# Altium footprint library Nanjar's Library.PcbLib: 153 footprints (part 1 of 10)
Each footprint in its own frame and in the unit in brackets; x right, y up, seen from the top. Pads: shape width x height; smd on the part's side, far side on the other; paste and mask are expansions set on the pad; w line width, h text height; cw(c..) or ccw(c..) is an arc to the next point about the centre after c.
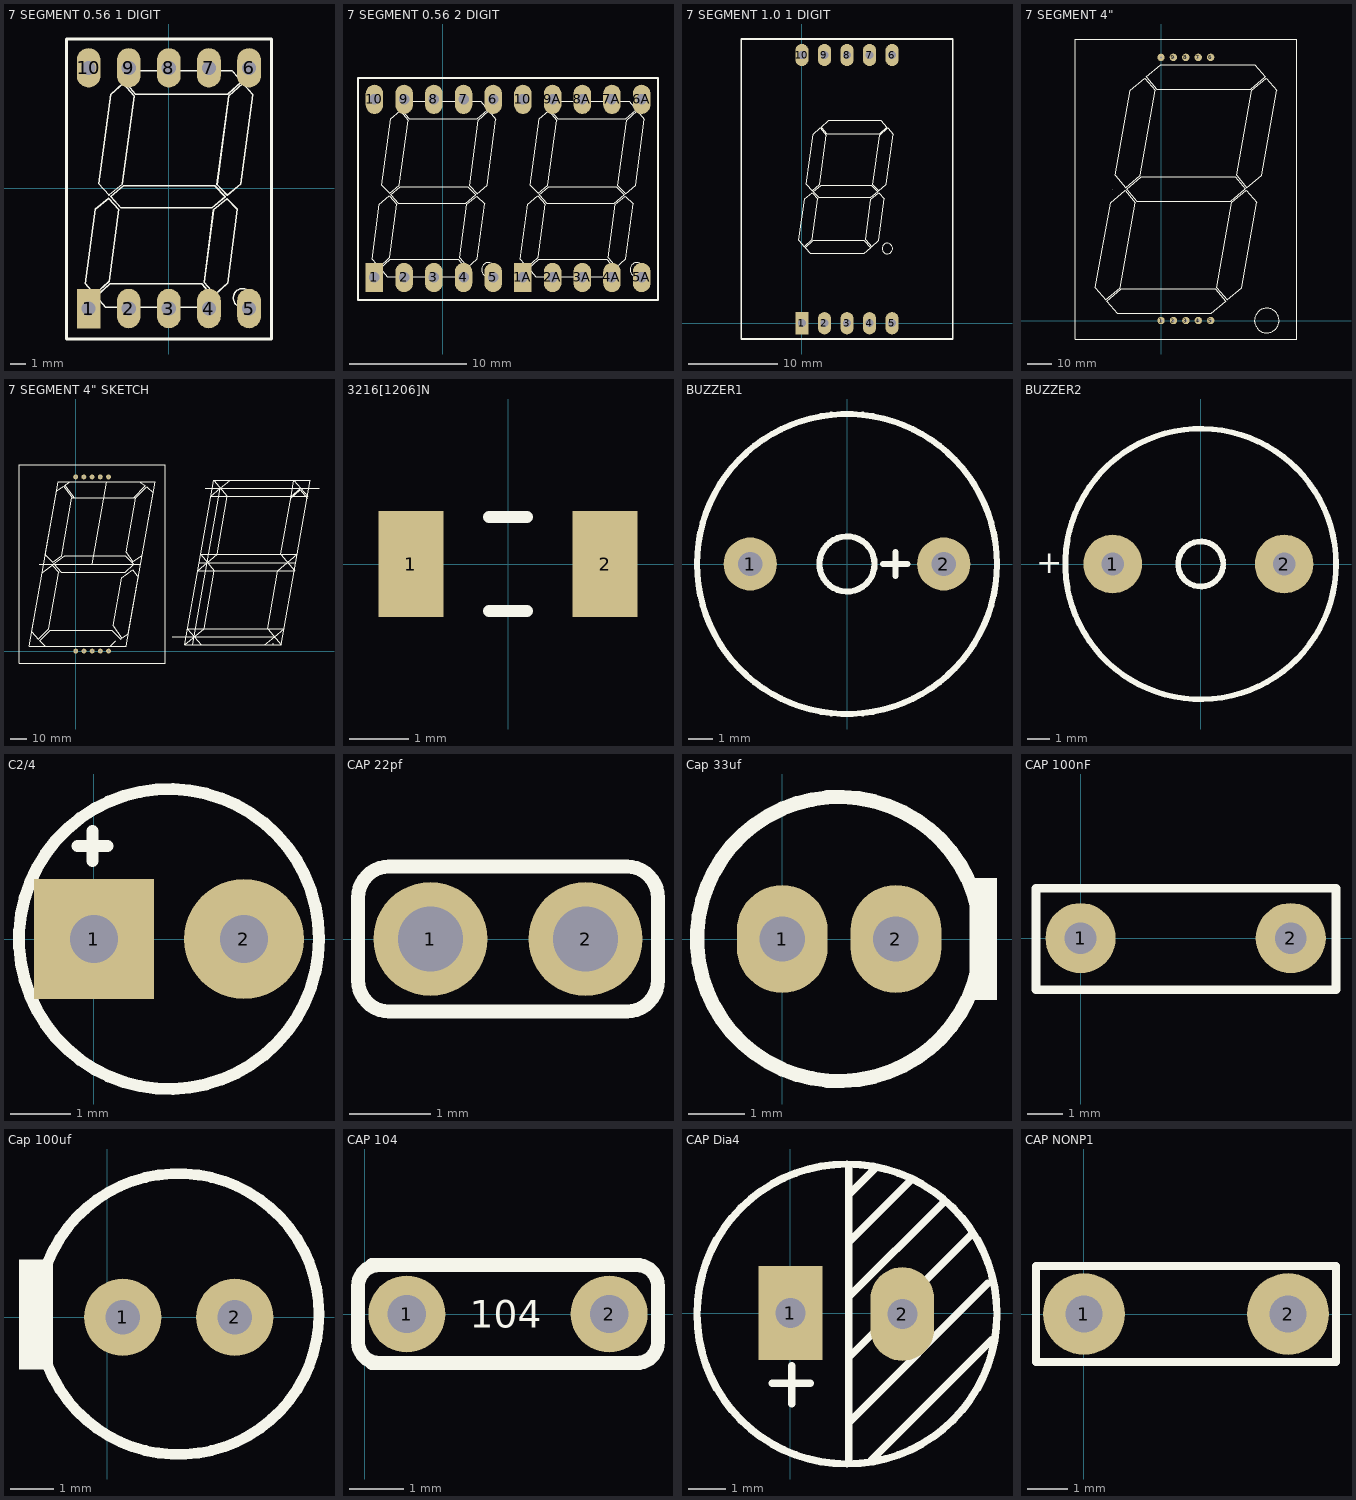
[diagram p0: the footprints below, top view; thin cyan lines are the x and y axes]

## 7 SEGMENT 0.56 1 DIGIT [mm]
pads (10):
  rect 1.5x2.5 hole 0.9: 1(-5.08,-7.62)
  oval 1.5x2.5 hole 0.9: 2(-2.54,-7.62) 3(0,-7.62) 4(2.54,-7.62) 5(5.08,-7.62) 6(5.08,7.62) 7(2.54,7.62) 8(0,7.62) 9(-2.54,7.62) 10(-5.08,7.62)
Top Overlay:
  circle w0.1: c4.676,-6.95 r0.595
  lines w0.1: -5.289,-6.04 -4.66,-1.335 -3.809,-0.643 -3.169,-1.34 -3.769,-5.9 -4.689,-6.73 -5.289,-6.04 ; -4.599,-6.85 -3.989,-7.55 2.021,-7.55 2.791,-6.86 2.091,-6.05 -3.719,-6.05 -4.599,-6.85 ; -4.449,0.29 -3.789,-0.43 -2.939,0.27 -2.199,5.84 -2.889,6.64 -3.683,5.939 -4.449,0.29 ; -3.679,-0.53 -2.869,0.15 2.911,0.15 3.579,-0.545 2.722,-1.25 -3.029,-1.25 -3.679,-0.53 ; -2.779,6.74 -1.989,7.45 4.001,7.45 4.611,6.74 3.731,5.95 -2.109,5.95 -2.779,6.74 ; 2.231,-5.95 2.831,-1.37 3.681,-0.66 4.341,-1.33 3.721,-6.01 2.911,-6.74 2.231,-5.95 ; 3.051,0.23 3.704,-0.441 4.557,0.27 5.311,5.93 4.701,6.64 3.801,5.84 3.051,0.23
  lines w0.2: -6.489,-9.55 -6.489,9.45 6.511,9.45 6.511,-9.55 -6.489,-9.55
3D body "7 SEGMENT 0.56 inc.step": height 8, standoff -4, extent -6.35,-9.525 6.35,9.525

## 7 SEGMENT 0.56 2 DIGIT [mm]
pads (20):
  rect 1.5x2.5 hole 0.9: 1(-5.842,6.985) 1A(6.858,6.985)
  oval 1.5x2.5 hole 0.9: 2(-3.302,6.985) 2A(9.398,6.985) 3(-0.762,6.985) 3A(11.938,6.985) 4(1.778,6.985) 4A(14.478,6.985) 5(4.318,6.985) 5A(17.018,6.985) 6(4.318,22.225) 6A(17.018,22.225) 7(1.778,22.225) 7A(14.478,22.225) 8(-0.762,22.225) 8A(11.938,22.225) 9(-3.302,22.225) 9A(9.398,22.225) 10(-5.842,22.225) 10(6.858,22.225)
Top Overlay:
  circle w0.1: c16.614,7.655 r0.595
  circle w0.1: c3.914,7.655 r0.595
  lines w0.1: -6.051,8.565 -5.422,13.27 -4.571,13.962 -3.931,13.265 -4.531,8.705 -5.451,7.875 -6.051,8.565 ; -5.361,7.755 -4.751,7.055 1.259,7.055 2.029,7.745 1.329,8.555 -4.481,8.555 -5.361,7.755 ; -5.211,14.895 -4.551,14.175 -3.701,14.875 -2.961,20.445 -3.651,21.245 -4.445,20.544 -5.211,14.895 ; -4.441,14.075 -3.631,14.755 2.149,14.755 2.817,14.06 1.96,13.355 -3.791,13.355 -4.441,14.075 ; -3.541,21.345 -2.751,22.055 3.239,22.055 3.849,21.345 2.969,20.555 -2.871,20.555 -3.541,21.345 ; 1.469,8.655 2.069,13.235 2.919,13.945 3.579,13.275 2.959,8.595 2.149,7.865 1.469,8.655 ; 2.289,14.835 2.942,14.164 3.795,14.875 4.549,20.535 3.939,21.245 3.039,20.445 2.289,14.835 ; 6.649,8.565 7.249,7.875 8.169,8.705 8.769,13.265 8.129,13.962 7.278,13.27 6.649,8.565 ; 7.339,7.755 8.219,8.555 14.029,8.555 14.729,7.745 13.959,7.055 7.949,7.055 7.339,7.755 ; 7.489,14.895 8.255,20.544 9.049,21.245 9.739,20.445 8.999,14.875 8.149,14.175 7.489,14.895 ; 8.259,14.075 8.909,13.355 14.66,13.355 15.517,14.06 14.849,14.755 9.069,14.755 8.259,14.075 ; 9.159,21.345 9.829,20.555 15.669,20.555 16.549,21.345 15.939,22.055 9.949,22.055 9.159,21.345 ; 14.169,8.655 14.849,7.865 15.659,8.595 16.279,13.275 15.619,13.945 14.769,13.235 14.169,8.655 ; 14.989,14.835 15.739,20.445 16.639,21.245 17.249,20.535 16.495,14.875 15.642,14.164 14.989,14.835
  lines w0.2: 5.576,5.055 18.415,5.055 18.415,24.055 ; 5.576,24.055 18.415,24.055 ; 5.749,5.055 -7.251,5.055 -7.251,24.055 5.749,24.055 ; 18.149,24.055 18.415,24.055
3D body "end-el-san Co Ltd-King Bright SA-SC56-21.step": height 8, standoff -4, extent -7.112,5.08 5.588,24.13
3D body "end-el-san Co Ltd-King Bright SA-SC56-21.step": height 8, standoff -4, extent 5.588,5.08 18.288,24.13

## 7 SEGMENT 1.0 1 DIGIT [mm]
pads (10):
  rect 1.5x2.5 hole 0.9: 1(0,0)
  oval 1.5x2.5 hole 0.9: 2(2.54,0) 3(5.08,0) 4(7.62,0) 5(10.16,0) 6(10.16,30.226) 7(7.62,30.226) 8(5.08,30.226) 9(2.54,30.226) 10(0,30.226)
Top Overlay:
  circle w0.1: c9.629,8.417 r0.595
  lines w0.1: -0.336,9.327 0.264,8.637 1.184,9.467 1.784,14.027 1.144,14.724 0.293,14.032 -0.336,9.327 ; 0.354,8.517 1.297,9.374 6.995,9.374 7.744,8.507 7.038,7.874 0.915,7.874 0.354,8.517 ; 0.504,15.657 1.27,21.306 2.064,22.007 2.754,21.207 2.014,15.637 1.164,14.937 0.504,15.657 ; 1.274,14.837 1.873,14.174 7.744,14.174 8.532,14.822 7.81,15.574 2.152,15.574 1.274,14.837 ; 2.174,22.107 2.796,21.374 8.748,21.374 9.564,22.107 8.905,22.874 3.028,22.874 2.174,22.107 ; 7.184,9.417 7.864,8.627 8.674,9.357 9.294,14.037 8.634,14.707 7.784,13.997 7.184,9.417 ; 8.004,15.597 8.754,21.207 9.654,22.007 10.264,21.297 9.51,15.637 8.657,14.926 8.004,15.597
  lines w0.2: -6.833,-1.778 -6.833,32.029 ; -6.818,32.029 16.993,32.029 16.993,-1.778 -6.807,-1.778
3D body "User_Library-King_Bright_SA10-21_1.0_inch.stp": height 10.5, standoff -4, extent -6.92,-1.869 17.08,32.131

## 7 SEGMENT 4" [mm]
pads (10):
  round 3 hole 1: 1(0,0) 2(5.05,0) 3(10.1,0) 4(15.15,0) 5(20.2,0)
  round 3 hole 0.8: 6(20.175,107.025) 7(15.125,107.025) 8(10.075,107.025) 9(5.025,107.025) 10(-0.025,107.025)
Top Overlay:
  circle w0.254: c43,0 r5
  lines w0.254: -8.474,59.011 -2.373,93.611 -6.569,98.609 -12.511,93.608 -18.598,59.011 -14.421,53.989 -8.466,59.01 ; -1.786,94.1 36.396,94.1 ; -1.786,94.104 -5.982,99.102 -0.04,104.104 38.16,104.101 42.363,99.101 36.396,94.102 ; 32.828,13.392 26.869,8.392 22.674,13.392 28.78,48.023 34.735,53.024 38.929,48.023 ; 32.833,13.422 38.934,48.022 ; 36.81,93.609 42.777,98.608 46.98,93.607 40.865,59.01 34.909,54.008 30.717,59.009 36.818,93.608 ; -34.85,-7.5 -34.85,114.5 55.15,114.5 55.15,-7.5 -34.85,-7.5 ; -26.671,13.392 -22.476,8.395 -16.517,13.397 -10.419,47.983 -14.595,53.004 -20.542,47.983 -26.671,13.392 ; -22.063,7.902 -16.104,12.9 22.087,12.9 26.282,7.9 20.324,2.9 -17.868,2.905 -22.063,7.902 ; -19.6,53.5 -19.6,53.5 ; -14.008,53.497 -8.061,58.519 30.13,58.517 34.322,53.516 28.367,48.515 -9.832,48.475 -14.008,53.497
3D body "SA40-18 BK.step": height 15, standoff -7, extent -34.85,-7.5 55.15,114.5

## 7 SEGMENT 4" SKETCH [mm]
pads (10):
  round 3 hole 1: 1(0,0) 2(5.05,0) 3(10.1,0) 4(15.15,0) 5(20.2,0)
  round 3 hole 0.8: 6(20.175,107.025) 7(15.125,107.025) 8(10.075,107.025) 9(5.025,107.025) 10(-0.025,107.025)
Top Overlay:
  lines w0.254: -22.5,53.5 10.15,53.5 ; -20.547,48.127 -26.926,11.952 -22.959,7.116 -16.478,13.615 -10.332,48.475 -14.349,52.724 -14.349,53.5 ; -20.537,48.125 -14.425,52.67 ; -18.61,59.14 -14.003,54.533 -8.551,58.587 ; -18.606,59.139 -11.683,98.401 -7.458,101.36 -2.275,94.1 ; -8.748,48.517 30.567,48.517 35.537,53.487 30.508,58.517 -6.732,58.517 -13.462,53.512 -8.748,48.526 ; -8.552,58.588 -7.665,63.6 ; -8.23,60.398 -2.287,94.102 ; -2.271,94.104 -1.03,94.104 -6.646,101.971 -3.5,104.1 39.175,104.1 42.869,101.675 35.663,94.1 36.905,94.1 ; -1.03,94.1 35.663,94.1 ; 19.072,104.1 10.15,53.5 ; 21.231,2.9 24.706,6.375 ; 23.4,2.9 -18.775,2.9 -22.25,6.375 -15.725,12.9 22,12.9 27.7,7.2 ; 59.275,8.798 122.235,8.798 ; 72.012,3.824 88.971,100 ; 75.853,54.398 84.775,104.998 ; 75.853,54.323 135.353,54.323 ; 75.853,54.398 66.931,3.798 ; 77.085,3.803 72.89,8.801 68.695,13.798 78.849,13.798 118.04,13.798 ; 79.625,99.999 149.524,99.999 ; 86.9,59.415 126.08,59.415 136.231,59.415 124.32,49.413 118.04,13.798 ; 94.913,105.002 88.971,100 ; 116.277,3.798 122.235,8.798 ; 121.358,3.822 121.531,4.807 ; 132.176,94.015 138.143,99.014 142.346,94.013 ; 135.353,54.398 144.275,104.999 84.775,104.998 ; 135.353,54.399 126.431,3.798 ; 137.316,99.999 138.316,99.998 ; -19.6,53.5 -10.678,104.1 48.822,104.1 39.9,53.5 ; -19.6,53.5 -28.522,2.9 30.978,2.9 39.9,53.5 ; -19.6,53.5 -19.6,53.5 ; 10.15,53.5 39.9,53.5 ; 36.905,94.1 43.591,101.129 47.628,97.326 40.875,59.029 34.98,54.901 30.996,60.591 36.905,94.1 ; 66.931,3.798 78.849,13.803 85.121,49.373 ; 66.931,3.798 126.431,3.798 ; 84.775,104.998 93.166,95.002 86.892,59.417 ; 85.121,49.373 124.317,49.414 134.469,49.414 126.083,59.415 132.357,94.998 94.423,94.998 93.166,94.998 83.029,94.998 88.971,100 ; 85.121,49.373 74.997,49.373 86.892,59.417 ; 85.121,49.373 76.768,59.417 86.892,59.417 ; 118.04,13.798 126.431,3.798 ; 118.04,13.798 128.194,13.798 122.235,8.798 ; 132.349,95 138.316,99.998 ; 132.349,95 138.316,99.998 ; 132.349,95 134.112,104.999 138.316,99.998 ; 132.349,95 142.52,94.998 138.316,99.998 ; -34.85,-7.5 -34.85,114.5 55.15,114.5 55.15,-7.5 -34.85,-7.5 ; 23.041,15.476 28.426,7.785 32.32,10.512 38.445,45.25 35.195,49.893 28.253,45.032 23.041,15.476
3D body "SA40-18 BK.step": height 15, standoff -7, extent -34.85,-7.5 55.15,114.5

## 3216[1206]N [mm] "Chip Resistor; Body 3.2 x 1.6 mm (LxW typ)"
height 2.54
pads (2):
  rect 1.1x1.8 smd: 1(-1.65,0) 2(1.65,0)
Top Overlay:
  lines w0.2: -0.325,-0.8 0.325,-0.8 ; -0.325,0.8 0.325,0.8
3D body "User Library-1206 SMD Resistor.step": height 1, standoff 0, extent -1.6,-0.8 1.6,0.8

## BUZZER1 [mm] "5V"
pads (2):
  round 2.2 hole 1: 1(-4,0) 2(4,0)
Top Overlay:
  circle w0.254: c0,0 r1.14
  circle w0.254: c0,0 r6.2
  lines w0.254: 1.5,0 2.5,0 ; 2,-0.5 2,0.5

## BUZZER2 [mm]
pads (2):
  round 2.6 hole 1: 1(-3.9,0) 2(3.7,0)
Top Overlay:
  circle w0.254: c0,0 r1
  circle w0.254: c0,0 r6
  text "+" at -7.3,-0.4 h1.02
3D body "User Library-WST-1203UX.step": height 9.65, standoff -4.5, extent -9.554,-6 5.9,6

## C2/4 [mm]
pads (2):
  rect 2x2 hole 0.8: 1(0,0)
  round 2 hole 0.8: 2(2.5,0)
Top Overlay:
  circle w0.2: c1.25,0 r2.5
  lines w0.2: -0.275,1.55 0.225,1.55 ; -0.025,1.3 -0.025,1.8

## CAP 22pf [mm] "Capasitor Troughole"
pads (2):
  round 1.4 hole 0.8: 1(1.778,0) 2(3.683,0)
Top Overlay:
  lines w0.17: 0.889,-0.508 ccw(c1.27,-0.508) 1.27,-0.889 4.191,-0.889 ccw(c4.191,-0.508) 4.572,-0.508 4.572,0.508 ccw(c4.191,0.508) 4.191,0.889 1.27,0.889 ccw(c1.27,0.508) 0.889,0.508 0.889,-0.508
3D body "User Library-0,22uF Capacitor 2,54 mm.step": height 4, standoff -2.25, extent 0.872,-1.105 4.572,1.105

## Cap 33uf [mm]
pads (2):
  oval 1.6x1.9 hole 0.8: 1(0,0) 2(2,0)
Top Overlay:
  circle w0.254: c1,0 r2.5
  rectangle: 3.3,-1.071 3.78,1.071
3D body "User Library-Cap-EL(5x11-2)T.step": height 11.4, standoff -2.4, extent -1.485,-2.489 3.517,2.511

## CAP 100nF [mm] "Capasitor Troughole"
pads (2):
  round 2 hole 0.9: 1(0,0) 2(6,0)
Top Overlay:
  lines w0.254: -1.27,-1.473 -1.27,1.422 7.29,1.422 7.29,-1.473 -1.27,-1.473
3D body "Cap-100n.step": height 7.6, standoff -4.6, extent -0.73,-1.3 6.77,1.2

## Cap 100uf [mm]
pads (2):
  round 1.8 hole 0.8: 1(0.356,0) 2(2.967,0)
Top Overlay:
  circle w0.25: c1.655,0.076 r3.273
  rectangle: -2.06,-1.219 -1.27,1.346
3D body "User Library-Cap-EL(6_3x11-2_5).step": height 11.5, standoff -2.7, extent -1.524,-3.175 4.778,3.112

## CAP 104 [mm] "Capasitor Troughole"
pads (2):
  round 1.4 hole 0.7: 1(0.762,0) 2(4.445,0)
Top Overlay:
  lines w0.254: 0.127,-0.889 4.999,-0.889 ; 0.127,0.889 4.999,0.889 ; 0.254,-0.889 cw(c0.254,-0.508) -0.127,-0.508 -0.127,0.508 cw(c0.254,0.508) 0.254,0.889 ; 4.953,-0.889 ccw(c4.953,-0.508) 5.334,-0.508 5.334,0.508 ccw(c4.953,0.508) 4.953,0.889
  text "104" at 1.905,-0.254 h0.5
3D body "User Library-Ceramic Capacitor 5x3_75mm.step": height 6.46, standoff -2.5, extent 0.081,-1 4.999,1

## CAP Dia4 [mm]
pads (2):
  rect 1.7x2.5 hole 0.8: 1(0,0)
  oval 1.7x2.5 hole 0.8: 2(2.982,-0.026)
Top Overlay:
  circle w0.2: c1.507,-0.026 r4
  lines w0.2: -0.493,-1.876 0.523,-1.876 ; 0.036,-2.425 0.036,-1.409 ; 1.557,-3.982 1.557,3.936 ; 1.557,-2.051 1.557,-2.026 ; 1.557,-0.801 1.557,-1.112 1.59,-1.146 4.862,2.126 ; 1.557,-0.376 1.557,-0.051 ; 1.557,0.874 1.557,0.46 1.572,0.445 4.057,2.931 ; 1.561,1.903 3.228,3.57 ; 1.562,-2.911 5.266,0.793 ; 1.599,3.191 2.29,3.883 ; 2.157,-3.924 5.369,-0.712

## CAP NONP1 [mm]
pads (2):
  round 2 hole 0.9: 1(0,0) 2(5,0)
Top Overlay:
  lines w0.2: -1.175,-1.175 -1.175,1.175 6.175,1.175 6.175,-1.175 -1.175,-1.175
3D body "User Library-Cap-5 (7_2x6_5x2_2).step": height 7.1, standoff -3.4, extent -1.1,-1.1 6.1,1.1